# Altium footprint library Elements_LT.PcbLib: 145 footprints (part 4 of 10)
Each footprint in its own frame and in the unit in brackets; x right, y up, seen from the top. Pads: shape width x height; smd on the part's side, far side on the other; paste and mask are expansions set on the pad; w line width, h text height; cw(c..) or ccw(c..) is an arc to the next point about the centre after c.
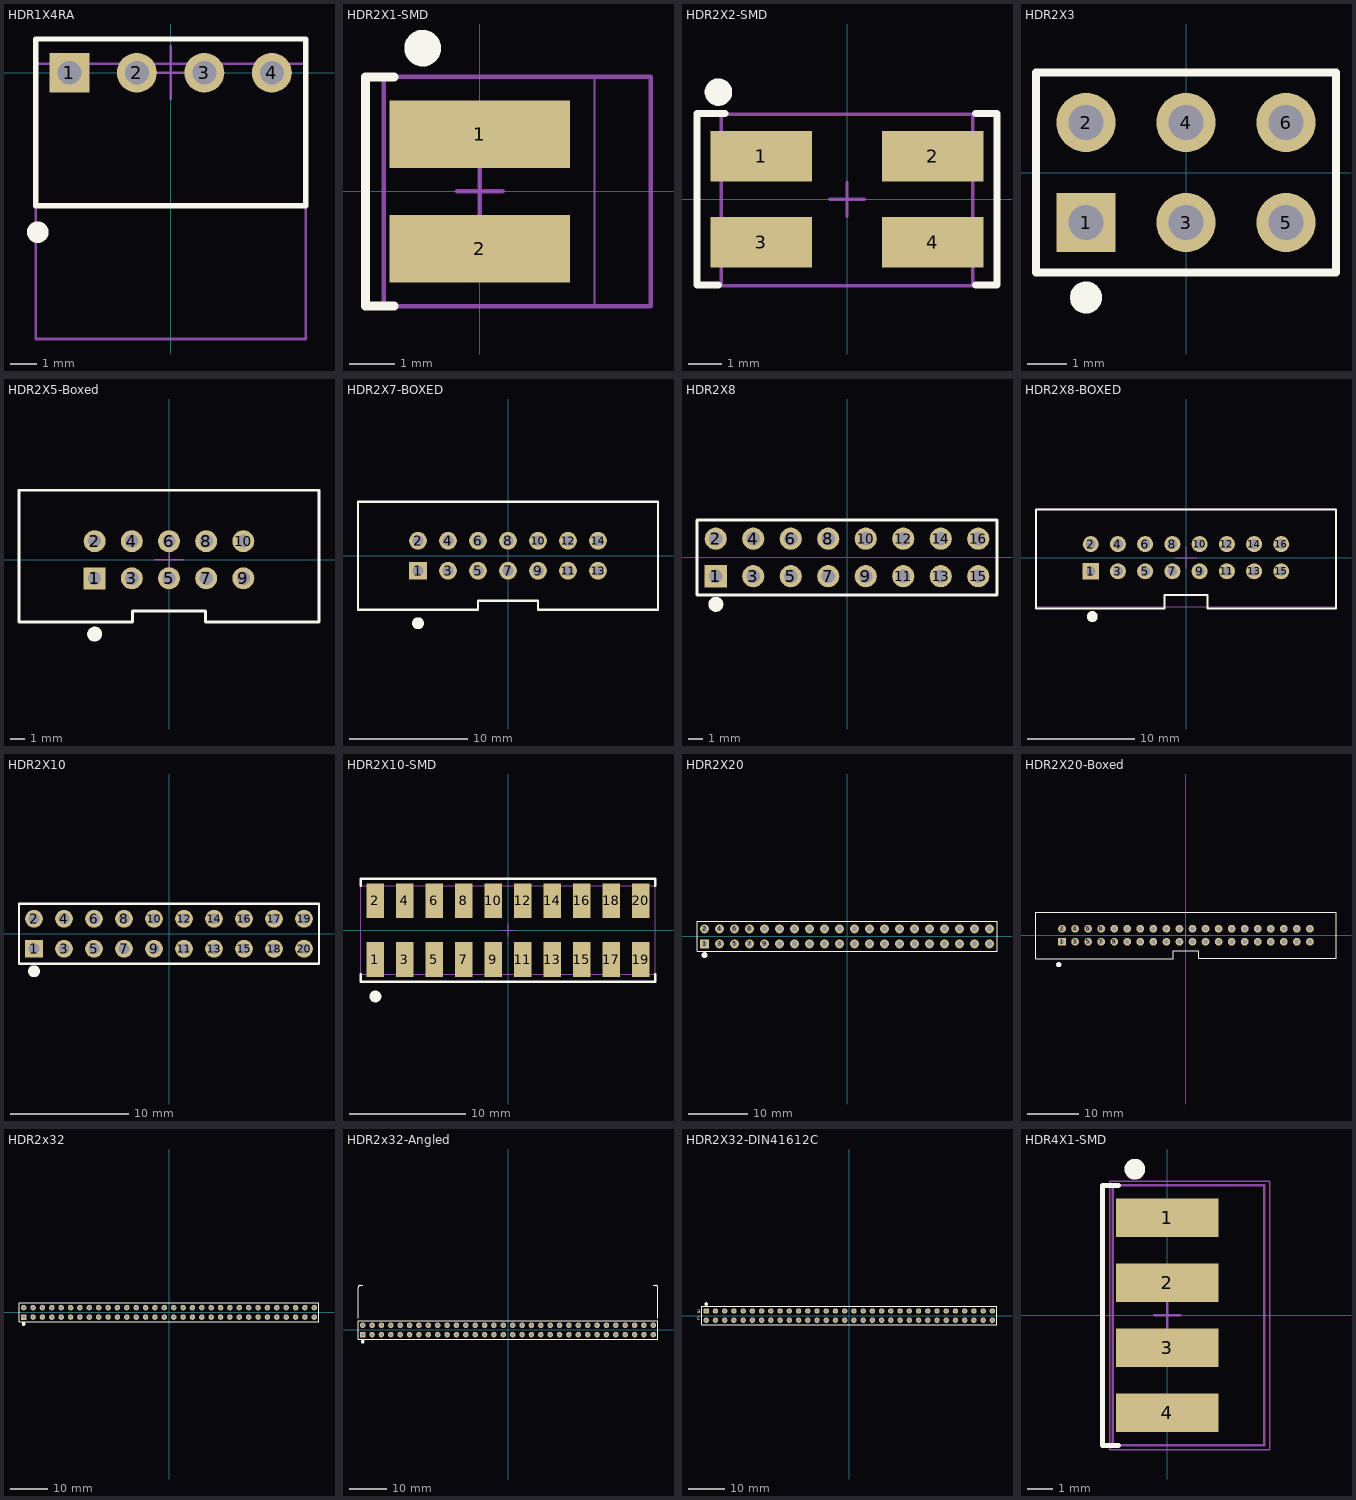
[diagram p3: the footprints below, top view; thin cyan lines are the x and y axes]

## HDR1X4RA [mm] "Connector; Header; 4 Position; Right Angle"
pads (4):
  rect 1.5x1.5 hole 0.9: 1(-3.81,0)
  round 1.5 hole 0.9: 2(-1.27,0) 3(1.27,0) 4(3.81,0)
Top Overlay:
  circle w0.406: c-5,-6 r0.203
  lines w0.2: -5.08,-5 5.08,-5 5.08,1.27 -5.08,1.27 -5.08,-5
Mechanical 13:
  lines w0.1: -5.08,-10.02 -5.08,0.34 5.08,0.34 5.08,-10.02 -5.08,-10.02
Mechanical 15:
  lines w0.1: -1,0 1,0 ; 0,-1 0,1
3D body "61300411021 (rev1).stp": height 2.77, standoff -2.77, extent -5.08,-10.02 5.08,0.34

## HDR2X1-SMD [mm] "Connector; Header; 2 Position; SMD"
pads (2):
  rect 4x1.5 smd: 1(0,1.27) 2(0,-1.27)
Top Overlay:
  circle w0.406: c-1.27,3.175 r0.203
  lines w0.2: -1.905,-2.54 -2.54,-2.54 -2.54,2.54 -1.905,2.54
Mechanical 13:
  lines w0.1: -2.134,-2.54 -2.134,2.54 3.785,2.54 3.785,-2.54 -2.134,-2.54
Mechanical 15:
  lines w0.05: -2.54,-2.54 2.54,-2.54 2.54,2.54 -2.54,2.54 -2.54,-2.54
  lines w0.1: -0.508,0 0.508,0 ; 0,-0.508 0,0.508
3D body "2x01_smd.stp": height 10.54, standoff -0.05, extent -2.134,-2.54 3.785,2.54

## HDR2X2-SMD [mm] "Connector; Header; 4 Position; SMD"
pads (4):
  rect 3x1.5 smd: 1(-2.54,1.27) 2(2.54,1.27) 3(-2.54,-1.27) 4(2.54,-1.27)
Top Overlay:
  circle w0.406: c-3.81,3.175 r0.203
  lines w0.2: -3.81,-2.54 -4.445,-2.54 -4.445,2.54 -3.607,2.54 ; 3.81,-2.54 4.445,-2.54 4.445,2.54 3.81,2.54
Mechanical 13:
  lines w0.1: -3.721,-2.57 3.721,-2.57 3.721,2.51 -3.721,2.51 -3.721,-2.57
Mechanical 15:
  lines w0.05: -4.445,-2.54 -4.445,2.54 4.445,2.54 4.445,-2.54 -4.445,-2.54
  lines w0.1: -0.508,0 0.508,0 ; 0,-0.508 0,0.508
3D body "2x02_smd.stp": height 14.44, standoff -0.04, extent -3.721,-2.57 3.721,2.51

## HDR2X3 [mm] "Connector; Header; 6 Position"
pads (6):
  rect 1.5x1.5 hole 0.9: 1(-2.54,-1.27)
  round 1.5 hole 0.9: 2(-2.54,1.27) 3(0,-1.27) 4(0,1.27) 5(2.54,-1.27) 6(2.54,1.27)
Top Overlay:
  circle w0.406: c-2.54,-3.175 r0.203
  lines w0.2: -3.81,-2.54 3.81,-2.54 3.81,2.54 -3.81,2.54 -3.81,-2.54
3D body "1x03.stp": height 8.54, standoff -3, extent -3.81,-2.54 3.81,0
3D body "1x03.stp": height 8.54, standoff -3, extent -3.81,0 3.81,2.54

## HDR2X5-Boxed [mm] "Connector; Header; 5x2 Position; Boxed"
pads (10):
  rect 1.5x1.5 hole 0.9: 1(-5.08,-1.27)
  round 1.5 hole 0.9: 2(-5.08,1.27) 3(-2.54,-1.27) 4(-2.54,1.27) 5(0,-1.27) 6(0,1.27) 7(2.54,-1.27) 8(2.54,1.27) 9(5.08,-1.27) 10(5.08,1.27)
Top Overlay:
  circle w0.508: c-5.08,-5.08 r0.254
  lines w0.2: -10.25,-4.25 -2.5,-4.25 -2.5,-3.5 2.5,-3.5 2.5,-4.25 10.25,-4.25 10.25,4.75 -10.25,4.75 -10.25,-4.25
Mechanical 15:
  lines w0.1: -1,0 1,0 ; 0,-1 0,1
3D body "c-1634688-10-c-3d.stp": height 9, standoff -3.15, extent -10.175,-4.35 10.175,4.65

## HDR2X7-BOXED [mm] "Connector; Header; 7x2 Position; Boxed"
pads (14):
  rect 1.5x1.5 hole 0.9: 1(-7.62,-1.27)
  round 1.5 hole 0.9: 2(-7.62,1.27) 3(-5.08,-1.27) 4(-5.08,1.27) 5(-2.54,-1.27) 6(-2.54,1.27) 7(0,-1.27) 8(0,1.27) 9(2.54,-1.27) 10(2.54,1.27) 11(5.08,-1.27) 12(5.08,1.27) 13(7.62,-1.27) 14(7.62,1.27)
Top Overlay:
  circle w0.508: c-7.62,-5.715 r0.254
  lines w0.2: -12.7,-4.572 -12.7,4.572 12.7,4.572 12.7,-4.572 2.54,-4.572 2.54,-3.81 -2.54,-3.81 -2.54,-4.572 -12.7,-4.572
3D body "c-5103309-02-b-3d.stp": height 10, standoff -2.9, extent -12.7,-4.572 12.7,4.572

## HDR2X8 [mm] "Connector; Header; 8x2 Position"
pads (16):
  rect 1.5x1.5 hole 0.9: 1(-8.89,-1.27)
  round 1.5 hole 0.9: 2(-8.89,1.27) 3(-6.35,-1.27) 4(-6.35,1.27) 5(-3.81,-1.27) 6(-3.81,1.27) 7(-1.27,-1.27) 8(-1.27,1.27) 9(1.27,-1.27) 10(1.27,1.27) 11(3.81,-1.27) 12(3.81,1.27) 13(6.35,-1.27) 14(6.35,1.27) 15(8.89,-1.27) 16(8.89,1.27)
Top Overlay:
  circle w0.508: c-8.89,-3.175 r0.254
  lines w0.2: -10.16,-2.54 -10.16,2.54 10.16,2.54 10.16,-2.54 2.54,-2.54 -2.54,-2.54 -10.16,-2.54
3D body "2x02.stp": height 8.54, standoff -3, extent -10.16,-2.54 -5.08,2.54
3D body "2x02.stp": height 8.54, standoff -3, extent -5.08,-2.54 0,2.54
3D body "2x02.stp": height 8.54, standoff -3, extent 0,-2.54 5.08,2.54
3D body "2x02.stp": height 8.54, standoff -3, extent 5.08,-2.54 10.16,2.54

## HDR2X8-BOXED [mm] "Connector; Header; 8x2 Position; Boxed"
pads (16):
  rect 1.5x1.5 hole 0.9: 1(-8.89,-1.27)
  round 1.5 hole 0.9: 2(-8.89,1.27) 3(-6.35,-1.27) 4(-6.35,1.27) 5(-3.81,-1.27) 6(-3.81,1.27) 7(-1.27,-1.27) 8(-1.27,1.27) 9(1.27,-1.27) 10(1.27,1.27) 11(3.81,-1.27) 12(3.81,1.27) 13(6.35,-1.27) 14(6.35,1.27) 15(8.89,-1.27) 16(8.89,1.27)
Top Overlay:
  circle w0.508: c-8.75,-5.5 r0.254
  lines w0.2: -14,-4.75 -14,4.5 14,4.5 14,-4.75 2,-4.75 2,-3.5 -2,-3.5 -2,-4.75 -14,-4.75
Mechanical 13:
  lines w0.1: -13.97,-4.572 -13.97,4.572 13.97,4.572 13.97,-4.572 -13.97,-4.572
Mechanical 15:
  lines w0.1: -1,0 1,0 ; 0,-1 0,1
3D body "c-5103308-3-b-3d.stp": height 10, standoff -2.9, extent -13.97,-4.572 13.97,4.572

## HDR2X10 [mm] "Connector; Header; 10x2 Position"
pads (20):
  rect 1.5x1.5 hole 0.9: 1(-11.43,-1.27)
  round 1.5 hole 0.9: 2(-11.43,1.27) 3(-8.89,-1.27) 4(-8.89,1.27) 5(-6.35,-1.27) 6(-6.35,1.27) 7(-3.81,-1.27) 8(-3.81,1.27) 9(-1.27,-1.27) 10(-1.27,1.27) 11(1.27,-1.27) 12(1.27,1.27) 13(3.81,-1.27) 14(3.81,1.27) 15(6.35,-1.27) 16(6.35,1.27) 17(8.89,1.27) 18(8.89,-1.27) 19(11.43,1.27) 20(11.43,-1.27)
Top Overlay:
  circle w0.508: c-11.43,-3.175 r0.254
  lines w0.2: -12.7,-2.54 -5.08,-2.54 0,-2.54 12.7,-2.54 12.7,2.54 -12.7,2.54 -12.7,-2.54
3D body "2x02.stp": height 8.54, standoff -3, extent 2.54,-2.54 7.62,2.54
3D body "2x02.stp": height 8.54, standoff -3, extent -2.54,-2.54 2.54,2.54
3D body "2x02.stp": height 8.54, standoff -3, extent -7.62,-2.54 -2.54,2.54
3D body "2x02.stp": height 8.54, standoff -3, extent -12.7,-2.54 -7.62,2.54
3D body "2x02.stp": height 8.54, standoff -3, extent 7.62,-2.54 12.7,2.54

## HDR2X10-SMD [mm] "Connector; Header; 10x2 Position, SMD"
pads (20):
  rect 1.5x3 smd: 1(-11.43,-2.54) 2(-11.43,2.54) 3(-8.89,-2.54) 4(-8.89,2.54) 5(-6.35,-2.54) 6(-6.35,2.54) 7(-3.81,-2.54) 8(-3.81,2.54) 9(-1.27,-2.54) 10(-1.27,2.54) 11(1.27,-2.54) 12(1.27,2.54) 13(3.81,-2.54) 14(3.81,2.54) 15(6.35,-2.54) 16(6.35,2.54) 17(8.89,-2.54) 18(8.89,2.54) 19(11.43,-2.54) 20(11.43,2.54)
Top Overlay:
  circle w0.508: c-11.43,-5.715 r0.254
  lines w0.2: -12.7,-3.81 -12.7,-4.445 12.7,-4.445 12.7,-3.81 ; -12.7,3.81 -12.7,4.445 12.7,4.445 12.7,3.81
Mechanical 13:
  lines w0.1: -12.7,-3.81 -12.7,3.81 12.7,3.81 12.7,-3.81 -12.7,-3.81
Mechanical 15:
  lines w0.05: -12.7,-4.445 -12.7,4.445 12.7,4.445 12.7,-4.445 -12.7,-4.445
  lines w0.1: -0.508,0 0.508,0 ; 0,-0.508 0,0.508
3D body "c-1241050-10-a7-3d.stp": height 10.3, standoff 0.09, extent -12.7,-3.81 12.7,3.81

## HDR2X20 [mm] "Connector; Header; 20x2 Position"
pads (40):
  rect 1.5x1.5 hole 0.9: 1(-24.13,-1.27)
  round 1.5 hole 0.9: 2(-24.13,1.27) 3(-21.59,-1.27) 4(-21.59,1.27) 5(-19.05,-1.27) 6(-19.05,1.27) 7(-16.51,-1.27) 8(-16.51,1.27) 9(-13.97,-1.27) 10(-13.97,1.27) 11(-11.43,-1.27) 12(-11.43,1.27) 13(-8.89,-1.27) 14(-8.89,1.27) 15(-6.35,-1.27) 16(-6.35,1.27) 17(-3.81,-1.27) 18(-3.81,1.27) 19(-1.27,-1.27) 20(-1.27,1.27) 21(1.27,-1.27) 22(1.27,1.27) 23(3.81,-1.27) 24(3.81,1.27) 25(6.35,-1.27) 26(6.35,1.27) 27(8.89,-1.27) 28(8.89,1.27) 29(11.43,-1.27) 30(11.43,1.27) 31(13.97,-1.27) 32(13.97,1.27) 33(16.51,-1.27) 34(16.51,1.27) 35(19.05,-1.27) 36(19.05,1.27) 37(21.59,-1.27) 38(21.59,1.27) 39(24.13,-1.27) 40(24.13,1.27)
Top Overlay:
  circle w0.508: c-24.13,-3.175 r0.254
  lines w0.2: -25.4,-2.54 -3.175,-2.54 1.905,-2.54 25.4,-2.54 25.4,2.54 -25.4,2.54 -25.4,-2.54
3D body "2x02.stp": height 8.54, standoff -3, extent -10.16,-2.54 -5.08,2.54
3D body "2x02.stp": height 8.54, standoff -3, extent -15.24,-2.54 -10.16,2.54
3D body "2x02.stp": height 8.54, standoff -3, extent -20.32,-2.54 -15.24,2.54
3D body "2x02.stp": height 8.54, standoff -3, extent -25.4,-2.54 -20.32,2.54
3D body "2x02.stp": height 8.54, standoff -3, extent 10.16,-2.54 15.24,2.54
3D body "2x02.stp": height 8.54, standoff -3, extent 5.08,-2.54 10.16,2.54
3D body "2x02.stp": height 8.54, standoff -3, extent 0,-2.54 5.08,2.54
3D body "2x02.stp": height 8.54, standoff -3, extent -5.08,-2.54 0,2.54
3D body "2x02.stp": height 8.54, standoff -3, extent 15.24,-2.54 20.32,2.54
3D body "2x02.stp": height 8.54, standoff -3, extent 20.32,-2.54 25.4,2.54

## HDR2X20-Boxed [mm] "Connector; Header; 20x2 Position; Boxed"
pads (40):
  rect 1.5x1.5 hole 0.9: 1(-24.13,-1.27)
  round 1.5 hole 0.9: 2(-24.13,1.27) 3(-21.59,-1.27) 4(-21.59,1.27) 5(-19.05,-1.27) 6(-19.05,1.27) 7(-16.51,-1.27) 8(-16.51,1.27) 9(-13.97,-1.27) 10(-13.97,1.27) 11(-11.43,-1.27) 12(-11.43,1.27) 13(-8.89,-1.27) 14(-8.89,1.27) 15(-6.35,-1.27) 16(-6.35,1.27) 17(-3.81,-1.27) 18(-3.81,1.27) 19(-1.27,-1.27) 20(-1.27,1.27) 21(1.27,-1.27) 22(1.27,1.27) 23(3.81,-1.27) 24(3.81,1.27) 25(6.35,-1.27) 26(6.35,1.27) 27(8.89,-1.27) 28(8.89,1.27) 29(11.43,-1.27) 30(11.43,1.27) 31(13.97,-1.27) 32(13.97,1.27) 33(16.51,-1.27) 34(16.51,1.27) 35(19.05,-1.27) 36(19.05,1.27) 37(21.59,-1.27) 38(21.59,1.27) 39(24.13,-1.27) 40(24.13,1.27)
Top Overlay:
  circle w0.508: c-24.765,-5.715 r0.254
  lines w0.2: -29.2,-4.57 -29.2,4.5 29.21,4.5 29.21,-4.5 2.5,-4.5 2.5,-3 -2.5,-3 -2.5,-4.57 -29.2,-4.57
Mechanical 15:
  lines w0.1: -1,0 1,0 ; 0,-1 0,1
3D body "c-5103309-08-b-3d.stp": height 10, standoff -2.9, extent -29.2,-4.572 29.22,4.572

## HDR2x32 [mm] "Connector; Header; 32x2 Position"
pads (64):
  rect 1.5x1.5 hole 0.9: 1(-39.37,-1.27)
  round 1.5 hole 0.9: 2(-39.37,1.27) 3(-36.83,-1.27) 4(-36.83,1.27) 5(-34.29,-1.27) 6(-34.29,1.27) 7(-31.75,-1.27) 8(-31.75,1.27) 9(-29.21,-1.27) 10(-29.21,1.27) 11(-26.67,-1.27) 12(-26.67,1.27) 13(-24.13,-1.27) 14(-24.13,1.27) 15(-21.59,-1.27) 16(-21.59,1.27) 17(-19.05,-1.27) 18(-19.05,1.27) 19(-16.51,-1.27) 20(-16.51,1.27) 21(-13.97,-1.27) 22(-13.97,1.27) 23(-11.43,-1.27) 24(-11.43,1.27) 25(-8.89,-1.27) 26(-8.89,1.27) 27(-6.35,-1.27) 28(-6.35,1.27) 29(-3.81,-1.27) 30(-3.81,1.27) 31(-1.27,-1.27) 32(-1.27,1.27) 33(1.27,-1.27) 34(1.27,1.27) 35(3.81,-1.27) 36(3.81,1.27) 37(6.35,-1.27) 38(6.35,1.27) 39(8.89,-1.27) 40(8.89,1.27) 41(11.43,-1.27) 42(11.43,1.27) 43(13.97,-1.27) 44(13.97,1.27) 45(16.51,-1.27) 46(16.51,1.27) 47(19.05,-1.27) 48(19.05,1.27) 49(21.59,-1.27) 50(21.59,1.27) 51(24.13,-1.27) 52(24.13,1.27) 53(26.67,-1.27) 54(26.67,1.27) 55(29.21,-1.27) 56(29.21,1.27) 57(31.75,-1.27) 58(31.75,1.27) 59(34.29,-1.27) 60(34.29,1.27) 61(36.83,-1.27) 62(36.83,1.27) 63(39.37,-1.27) 64(39.37,1.27)
Top Overlay:
  circle w0.508: c-39.37,-3.175 r0.254
  lines w0.2: -40.64,-2.54 -40.64,2.54 40.64,2.54 40.64,-2.54 -40.64,-2.54
3D body "2x02.stp": height 8.54, standoff -3, extent 20.32,-2.54 25.4,2.54
3D body "2x02.stp": height 8.54, standoff -3, extent 25.4,-2.54 30.48,2.54
3D body "2x02.stp": height 8.54, standoff -3, extent 30.48,-2.54 35.56,2.54
3D body "2x02.stp": height 8.54, standoff -3, extent 35.56,-2.54 40.64,2.54
3D body "2x02.stp": height 8.54, standoff -3, extent 0,-2.54 5.08,2.54
3D body "2x02.stp": height 8.54, standoff -3, extent 5.08,-2.54 10.16,2.54
3D body "2x02.stp": height 8.54, standoff -3, extent 10.16,-2.54 15.24,2.54
3D body "2x02.stp": height 8.54, standoff -3, extent 15.24,-2.54 20.32,2.54
3D body "2x02.stp": height 8.54, standoff -3, extent -20.32,-2.54 -15.24,2.54
3D body "2x02.stp": height 8.54, standoff -3, extent -15.24,-2.54 -10.16,2.54
3D body "2x02.stp": height 8.54, standoff -3, extent -10.16,-2.54 -5.08,2.54
3D body "2x02.stp": height 8.54, standoff -3, extent -5.08,-2.54 0,2.54
3D body "2x02.stp": height 8.54, standoff -3, extent -25.4,-2.54 -20.32,2.54
3D body "2x02.stp": height 8.54, standoff -3, extent -30.48,-2.54 -25.4,2.54
3D body "2x02.stp": height 8.54, standoff -3, extent -35.56,-2.54 -30.48,2.54
3D body "2x02.stp": height 8.54, standoff -3, extent -40.64,-2.54 -35.56,2.54

## HDR2x32-Angled [mm] "Connector; Header; 32x2 Position; Angle 90"
pads (64):
  rect 1.5x1.5 hole 0.9: 1(-39.37,-1.27)
  round 1.5 hole 0.9: 2(-39.37,1.27) 3(-36.83,-1.27) 4(-36.83,1.27) 5(-34.29,-1.27) 6(-34.29,1.27) 7(-31.75,-1.27) 8(-31.75,1.27) 9(-29.21,-1.27) 10(-29.21,1.27) 11(-26.67,-1.27) 12(-26.67,1.27) 13(-24.13,-1.27) 14(-24.13,1.27) 15(-21.59,-1.27) 16(-21.59,1.27) 17(-19.05,-1.27) 18(-19.05,1.27) 19(-16.51,-1.27) 20(-16.51,1.27) 21(-13.97,-1.27) 22(-13.97,1.27) 23(-11.43,-1.27) 24(-11.43,1.27) 25(-8.89,-1.27) 26(-8.89,1.27) 27(-6.35,-1.27) 28(-6.35,1.27) 29(-3.81,-1.27) 30(-3.81,1.27) 31(-1.27,-1.27) 32(-1.27,1.27) 33(1.27,-1.27) 34(1.27,1.27) 35(3.81,-1.27) 36(3.81,1.27) 37(6.35,-1.27) 38(6.35,1.27) 39(8.89,-1.27) 40(8.89,1.27) 41(11.43,-1.27) 42(11.43,1.27) 43(13.97,-1.27) 44(13.97,1.27) 45(16.51,-1.27) 46(16.51,1.27) 47(19.05,-1.27) 48(19.05,1.27) 49(21.59,-1.27) 50(21.59,1.27) 51(24.13,-1.27) 52(24.13,1.27) 53(26.67,-1.27) 54(26.67,1.27) 55(29.21,-1.27) 56(29.21,1.27) 57(31.75,-1.27) 58(31.75,1.27) 59(34.29,-1.27) 60(34.29,1.27) 61(36.83,-1.27) 62(36.83,1.27) 63(39.37,-1.27) 64(39.37,1.27)
Top Overlay:
  circle w0.508: c-39.37,-3.175 r0.254
  lines w0.2: -40.64,3.175 -40.64,11.43 ; -40.005,12.065 -39.37,12.065 ; 39.37,12.065 40.005,12.065 ; 40.64,3.175 40.64,11.43 ; -40.64,-2.54 -40.64,2.54 40.64,2.54 40.64,-2.54 -40.64,-2.54
  lines w0.254: -40.64,11.43 cw(c-40.005,11.43) -40.005,12.065 ; 40.005,12.065 cw(c40.005,11.43) 40.64,11.43
3D body "2x08_90.stp": height 5.08, standoff -2, extent -40.64,-1.651 -20.32,12.229
3D body "2x08_90.stp": height 5.08, standoff -2, extent -20.32,-1.651 0,12.229
3D body "2x08_90.stp": height 5.08, standoff -2, extent 0,-1.651 20.32,12.229
3D body "2x08_90.stp": height 5.08, standoff -2, extent 20.32,-1.651 40.64,12.229

## HDR2X32-DIN41612C [mm] "Connector; DIN 41612 Bindings; 64 Position"
pads (64):
  rect 1.5x1.5 hole 0.9: A1(-39.37,1.27)
  round 1.5 hole 0.9: A2(-36.83,1.27) A3(-34.29,1.27) A4(-31.75,1.27) A5(-29.21,1.27) A6(-26.67,1.27) A7(-24.13,1.27) A8(-21.59,1.27) A9(-19.05,1.27) A10(-16.51,1.27) A11(-13.97,1.27) A12(-11.43,1.27) A13(-8.89,1.27) A14(-6.35,1.27) A15(-3.81,1.27) A16(-1.27,1.27) A17(1.27,1.27) A18(3.81,1.27) A19(6.35,1.27) A20(8.89,1.27) A21(11.43,1.27) A22(13.97,1.27) A23(16.51,1.27) A24(19.05,1.27) A25(21.59,1.27) A26(24.13,1.27) A27(26.67,1.27) A28(29.21,1.27) A29(31.75,1.27) A30(34.29,1.27) A31(36.83,1.27) A32(39.37,1.27) C1(-39.37,-1.27) C2(-36.83,-1.27) C3(-34.29,-1.27) C4(-31.75,-1.27) C5(-29.21,-1.27) C6(-26.67,-1.27) C7(-24.13,-1.27) C8(-21.59,-1.27) C9(-19.05,-1.27) C10(-16.51,-1.27) C11(-13.97,-1.27) C12(-11.43,-1.27) C13(-8.89,-1.27) C14(-6.35,-1.27) C15(-3.81,-1.27) C16(-1.27,-1.27) C17(1.27,-1.27) C18(3.81,-1.27) C19(6.35,-1.27) C20(8.89,-1.27) C21(11.43,-1.27) C22(13.97,-1.27) C23(16.51,-1.27) C24(19.05,-1.27) C25(21.59,-1.27) C26(24.13,-1.27) C27(26.67,-1.27) C28(29.21,-1.27) C29(31.75,-1.27) C30(34.29,-1.27) C31(36.83,-1.27) C32(39.37,-1.27)
Top Overlay:
  circle w0.508: c-39.37,3.175 r0.254
  lines w0.2: -40.64,-2.54 -40.64,2.54 40.64,2.54 40.64,-2.54 -40.64,-2.54
  text "c" at -41.91,-1.27 h1.2
  text "a" at -41.91,0.635 h1.2
3D body "2x02.stp": height 8.54, standoff -3, extent 20.32,-2.54 25.4,2.54
3D body "2x02.stp": height 8.54, standoff -3, extent 25.4,-2.54 30.48,2.54
3D body "2x02.stp": height 8.54, standoff -3, extent 30.48,-2.54 35.56,2.54
3D body "2x02.stp": height 8.54, standoff -3, extent 35.56,-2.54 40.64,2.54
3D body "2x02.stp": height 8.54, standoff -3, extent 0,-2.54 5.08,2.54
3D body "2x02.stp": height 8.54, standoff -3, extent 5.08,-2.54 10.16,2.54
3D body "2x02.stp": height 8.54, standoff -3, extent 10.16,-2.54 15.24,2.54
3D body "2x02.stp": height 8.54, standoff -3, extent 15.24,-2.54 20.32,2.54
3D body "2x02.stp": height 8.54, standoff -3, extent -20.32,-2.54 -15.24,2.54
3D body "2x02.stp": height 8.54, standoff -3, extent -15.24,-2.54 -10.16,2.54
3D body "2x02.stp": height 8.54, standoff -3, extent -10.16,-2.54 -5.08,2.54
3D body "2x02.stp": height 8.54, standoff -3, extent -5.08,-2.54 0,2.54
3D body "2x02.stp": height 8.54, standoff -3, extent -25.4,-2.54 -20.32,2.54
3D body "2x02.stp": height 8.54, standoff -3, extent -30.48,-2.54 -25.4,2.54
3D body "2x02.stp": height 8.54, standoff -3, extent -35.56,-2.54 -30.48,2.54
3D body "2x02.stp": height 8.54, standoff -3, extent -40.64,-2.54 -35.56,2.54

## HDR4X1-SMD [mm] "Connector; Header; 4 Position; SMD"
pads (4):
  rect 4x1.5 smd: 1(0,3.81) 2(0,1.27) 3(0,-1.27) 4(0,-3.81)
Top Overlay:
  circle w0.406: c-1.27,5.715 r0.203
  lines w0.2: -1.905,-5.08 -2.54,-5.08 -2.54,5.08 -1.905,5.08
Mechanical 13:
  lines w0.1: -2.134,-5.08 3.785,-5.08 3.785,5.08 -2.134,5.08 -2.134,-5.08
Mechanical 15:
  lines w0.05: -2.25,-5.25 4,-5.25 4,5.25 -2.25,5.25 -2.25,-5.25
  lines w0.1: -0.508,0 0.508,0 ; 0,-0.508 0,0.508
3D body "2x01_smd.stp": height 10.54, standoff -0.05, extent -2.134,-5.08 3.785,0
3D body "2x01_smd.stp": height 10.54, standoff -0.05, extent -2.134,0 3.785,5.08